# Altium footprint library Vowstar_Connector.PcbLib: 127 footprints (part 5 of 8)
Each footprint in its own frame and in the unit in brackets; x right, y up, seen from the top. Pads: shape width x height; smd on the part's side, far side on the other; paste and mask are expansions set on the pad; w line width, h text height; cw(c..) or ccw(c..) is an arc to the next point about the centre after c.
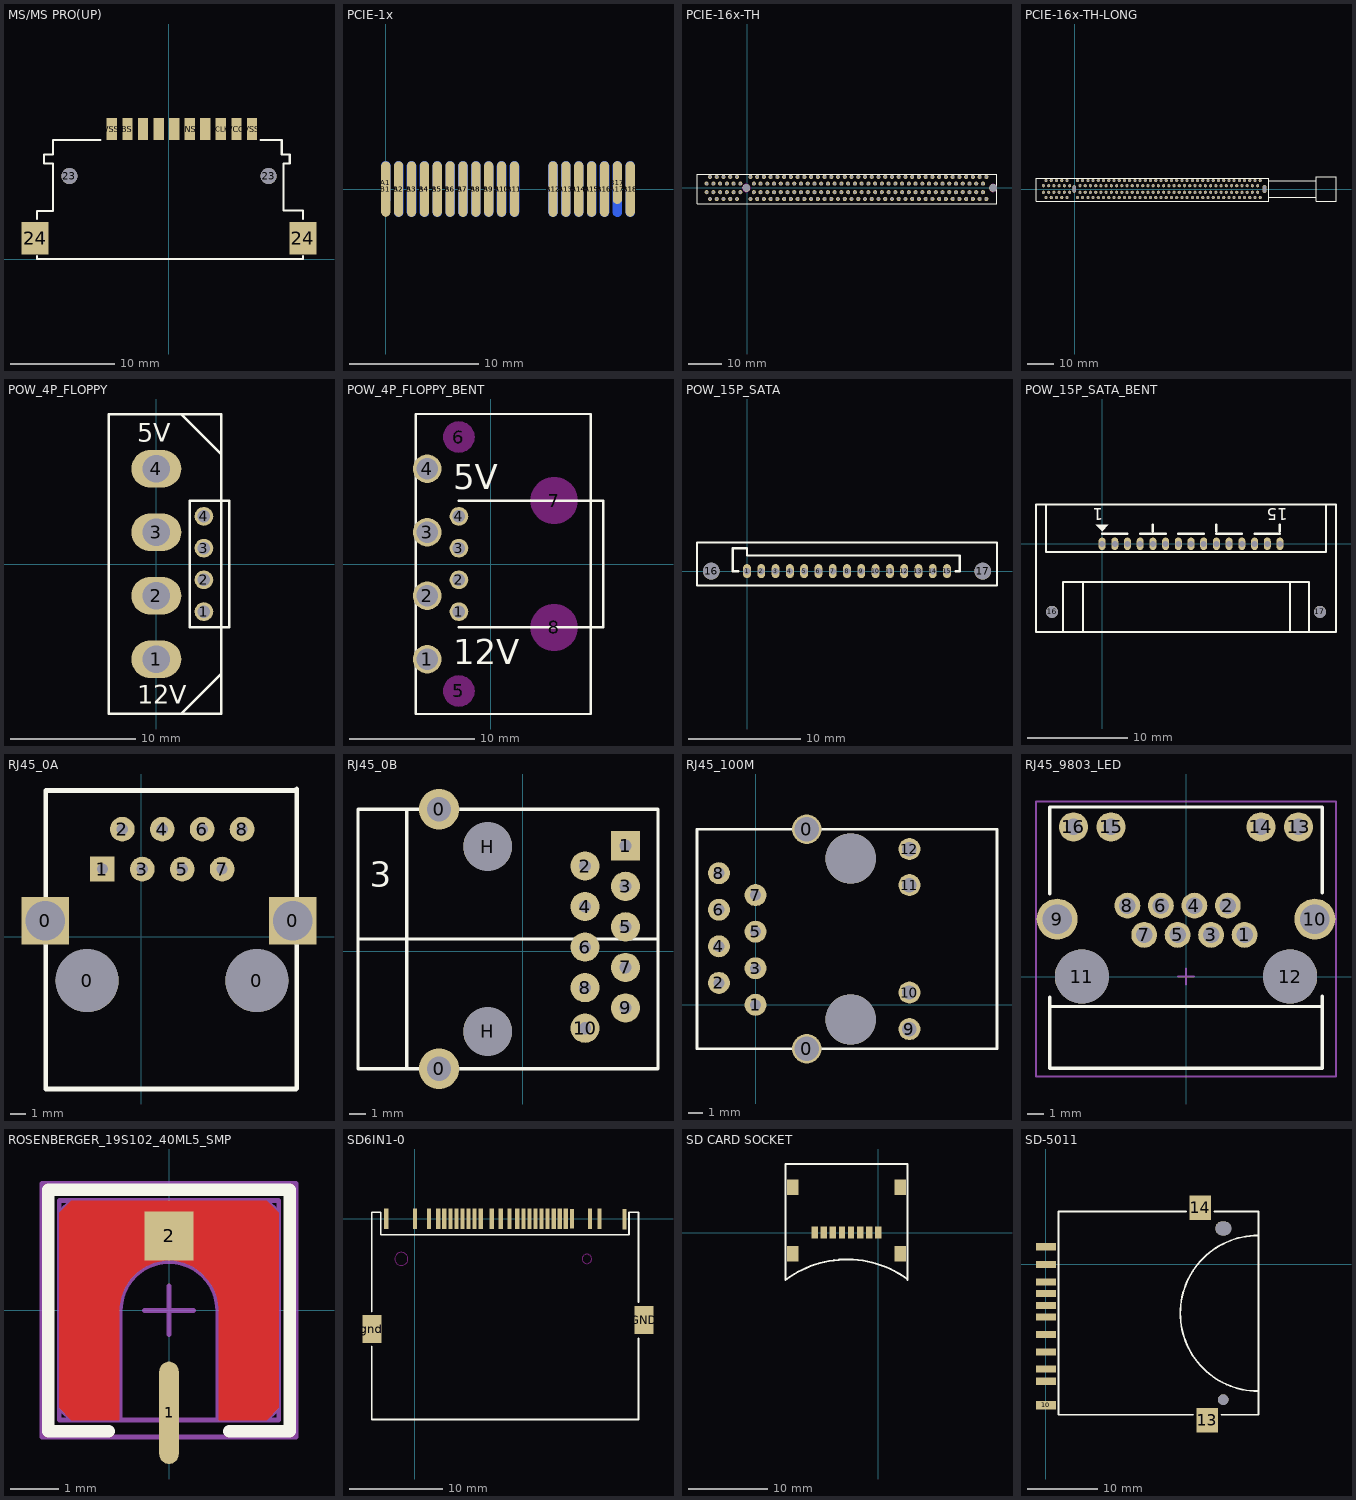
[diagram p4: the footprints below, top view; thin cyan lines are the x and y axes]

## MS/MS PRO(UP) [mm]
pads (15):
  round 0.2 on Top Overlay: 21(0.007,-0.003)
  round 1.55 on Top hole 1.55: 23(-9.593,7.997) 23(9.607,7.997)
  rect 2.6x3.1 smd: 24(-12.893,1.997) 24(12.907,1.997)
  rect 1x2.15 smd: BS(-3.993,12.527) INS(2.007,12.527) MSDATA0(-0.993,12.527) MSDATA1(-2.493,12.527) MSDATA2(0.507,12.527) MSDATA3(3.507,12.527) SCLK(5.007,12.527) VCC(6.507,12.527) VSS(-5.493,12.527) VSS(8.007,12.527)
Top Overlay:
  lines w0.203: -12.717,0.271 -12.717,-0.003 12.901,-0.003 12.901,0.271 ; -12.717,3.853 -12.717,4.649 -11.183,4.649 -11.183,9.213 -12.027,9.213 -12.027,10.057 -11.183,10.057 -11.183,11.454 -6.581,11.454 ; 8.815,11.454 10.868,11.454 10.868,10.057 11.635,10.057 11.635,9.213 11.022,9.213 11.022,4.688 12.901,4.688 ; 12.901,3.853 12.901,4.649

## PCIE-1x [mil]
pads (36):
  oval 28x131 smd far side: A1(0,19.68)
  oval 28x170 smd far side: A2(39.37,0) A3(78.74,0) A4(118.11,0) A5(157.48,0) A6(196.85,0) A7(236.22,0) A8(275.59,0) A9(314.96,0) A10(354.33,0) A11(393.7,0) A12(511.81,0) A13(551.18,0) A14(590.55,0) A15(629.92,0) A16(669.29,0) A17(708.66,0) A18(748.03,0)
  oval 28x170 smd: B1(0,0) B2(39.37,0) B3(78.74,0) B4(118.11,0) B5(157.48,0) B6(196.85,0) B7(236.22,0) B8(275.59,0) B9(314.96,0) B10(354.33,0) B11(393.7,0) B12(511.81,0) B13(551.18,0) B14(590.55,0) B15(629.92,0) B16(669.29,0) B18(748.03,0)
  oval 28x131 smd: B17(708.66,19.68)

## PCIE-16x-TH [mil] "PCIE-16x"
pads (166):
  round 48 hole 30: A1(-472.44,50) A2(-433.07,128.74) A3(-393.7,50) A4(-354.33,128.74) A5(-314.96,50) A6(-275.59,128.74) A7(-236.22,50) A8(-196.85,128.74) A9(-157.48,50) A10(-118.11,128.74) A11(-78.74,50) A12(39.37,128.74) A13(78.74,50) A14(118.11,128.74) A15(157.48,50) A16(196.85,128.74) A17(236.22,50) A18(275.59,128.74) A19(314.96,50) A20(354.33,128.74) A21(393.7,50) A22(433.07,128.74) A23(472.44,50) A24(511.81,128.74) A25(551.18,50) A26(590.55,128.74) A27(629.92,50) A28(669.29,128.74) A29(708.66,50) A30(748.03,128.74) A31(787.4,50) A32(826.77,128.74) A33(866.14,50) A34(905.51,128.74) A35(944.88,50) A36(984.25,128.74) A37(1023.62,50) A38(1062.99,128.74) A39(1102.36,50) A40(1141.73,128.74) A41(1181.1,50) A42(1220.47,128.74) A43(1259.84,50) A44(1299.21,128.74) A45(1338.58,50) A46(1377.95,128.74) A47(1417.32,50) A48(1456.69,128.74) A49(1496.06,50) A50(1535.43,128.74) A51(1574.8,50) A52(1614.17,128.74) A53(1653.54,50) A54(1692.91,128.74) A55(1732.28,50) A56(1771.65,128.74) A57(1811.02,50) A58(1850.39,128.74) A59(1889.76,50) A60(1929.13,128.74) A61(1968.5,50) A62(2007.87,128.74) A63(2047.24,50) A64(2086.61,128.74) A65(2125.98,50) A66(2165.35,128.74) A67(2204.72,50) A68(2244.09,128.74) A69(2283.46,50) A70(2322.83,128.74) A71(2362.2,50) A72(2401.57,128.74) A73(2440.94,50) A74(2480.32,128.74) A75(2519.68,50) A76(2559.06,128.74) A77(2598.43,50) A78(2637.8,128.74) A79(2677.17,50) A80(2716.54,128.74) A81(2755.91,50) A82(2795.28,128.74) B1(-472.44,-50) B2(-433.07,-128.74) B3(-393.7,-50) B4(-354.33,-128.74) B5(-314.96,-50) B6(-275.59,-128.74) B7(-236.22,-50) B8(-196.85,-128.74) B9(-157.48,-50) B10(-118.11,-128.74) B11(-78.74,-50) B12(39.37,-128.74) B13(78.74,-50) B14(118.11,-128.74) B15(157.48,-50) B16(196.85,-128.74) B17(236.22,-50) B18(275.59,-128.74) B19(314.96,-50) B20(354.33,-128.74) B21(393.7,-50) B22(433.07,-128.74) B23(472.44,-50) B24(511.81,-128.74) B25(551.18,-50) B26(590.55,-128.74) B27(629.92,-50) B28(669.29,-128.74) B29(708.66,-50) B30(748.03,-128.74) B31(787.4,-50) B32(826.77,-128.74) B33(866.14,-50) B34(905.51,-128.74) B35(944.88,-50) B36(984.25,-128.74) B37(1023.62,-50) B38(1062.99,-128.74) B39(1102.36,-50) B40(1141.73,-128.74) B41(1181.1,-50) B42(1220.47,-128.74) B43(1259.84,-50) B44(1299.21,-128.74) B45(1338.58,-50) B46(1377.95,-128.74) B47(1417.32,-50) B48(1456.69,-128.74) B49(1496.06,-50) B50(1535.43,-128.74) B51(1574.8,-50) B52(1614.17,-128.74) B53(1653.54,-50) B54(1692.91,-128.74) B55(1732.28,-50) B56(1771.65,-128.74) B57(1811.02,-50) B58(1850.39,-128.74) B59(1889.76,-50) B60(1929.13,-128.74) B61(1968.5,-50) B62(2007.87,-128.74) B63(2047.24,-50) B64(2086.61,-128.74) B65(2125.98,-50) B66(2165.35,-128.74) B67(2204.72,-50) B68(2244.09,-128.74) B69(2283.46,-50) B70(2322.83,-128.74) B71(2362.2,-50) B72(2401.57,-128.74) B73(2440.94,-50) B74(2480.32,-128.74) B75(2519.68,-50) B76(2559.06,-128.74) B77(2598.43,-50) B78(2637.8,-128.74) B79(2677.17,-50) B80(2716.54,-128.74) B81(2755.91,-50) B82(2795.28,-128.74)
  round 86.61 hole 86.61: M1(-7.87,0) M2(2874.02,0)
Top Overlay:
  lines w10: -585,-185 2920,-185 2920,160 -585,160 -585,-185
Keep-Out Layer:
  circle w3.94: c2874.02,0 r43.31
  circle w3.94: c-7.87,0 r43.31
3D body "Samtec-PCIE-164-02-D-F-TH.step": height 434.37, standoff -172.63, extent -585,-185 2919,154

## PCIE-16x-TH-LONG [mil] "PCIE-16x"
pads (166):
  round 48 hole 30: A1(-472.44,50) A2(-433.07,128.74) A3(-393.7,50) A4(-354.33,128.74) A5(-314.96,50) A6(-275.59,128.74) A7(-236.22,50) A8(-196.85,128.74) A9(-157.48,50) A10(-118.11,128.74) A11(-78.74,50) A12(39.37,128.74) A13(78.74,50) A14(118.11,128.74) A15(157.48,50) A16(196.85,128.74) A17(236.22,50) A18(275.59,128.74) A19(314.96,50) A20(354.33,128.74) A21(393.7,50) A22(433.07,128.74) A23(472.44,50) A24(511.81,128.74) A25(551.18,50) A26(590.55,128.74) A27(629.92,50) A28(669.29,128.74) A29(708.66,50) A30(748.03,128.74) A31(787.4,50) A32(826.77,128.74) A33(866.14,50) A34(905.51,128.74) A35(944.88,50) A36(984.25,128.74) A37(1023.62,50) A38(1062.99,128.74) A39(1102.36,50) A40(1141.73,128.74) A41(1181.1,50) A42(1220.47,128.74) A43(1259.84,50) A44(1299.21,128.74) A45(1338.58,50) A46(1377.95,128.74) A47(1417.32,50) A48(1456.69,128.74) A49(1496.06,50) A50(1535.43,128.74) A51(1574.8,50) A52(1614.17,128.74) A53(1653.54,50) A54(1692.91,128.74) A55(1732.28,50) A56(1771.65,128.74) A57(1811.02,50) A58(1850.39,128.74) A59(1889.76,50) A60(1929.13,128.74) A61(1968.5,50) A62(2007.87,128.74) A63(2047.24,50) A64(2086.61,128.74) A65(2125.98,50) A66(2165.35,128.74) A67(2204.72,50) A68(2244.09,128.74) A69(2283.46,50) A70(2322.83,128.74) A71(2362.2,50) A72(2401.57,128.74) A73(2440.94,50) A74(2480.32,128.74) A75(2519.68,50) A76(2559.06,128.74) A77(2598.43,50) A78(2637.8,128.74) A79(2677.17,50) A80(2716.54,128.74) A81(2755.91,50) A82(2795.28,128.74) B1(-472.44,-50) B2(-433.07,-128.74) B3(-393.7,-50) B4(-354.33,-128.74) B5(-314.96,-50) B6(-275.59,-128.74) B7(-236.22,-50) B8(-196.85,-128.74) B9(-157.48,-50) B10(-118.11,-128.74) B11(-78.74,-50) B12(39.37,-128.74) B13(78.74,-50) B14(118.11,-128.74) B15(157.48,-50) B16(196.85,-128.74) B17(236.22,-50) B18(275.59,-128.74) B19(314.96,-50) B20(354.33,-128.74) B21(393.7,-50) B22(433.07,-128.74) B23(472.44,-50) B24(511.81,-128.74) B25(551.18,-50) B26(590.55,-128.74) B27(629.92,-50) B28(669.29,-128.74) B29(708.66,-50) B30(748.03,-128.74) B31(787.4,-50) B32(826.77,-128.74) B33(866.14,-50) B34(905.51,-128.74) B35(944.88,-50) B36(984.25,-128.74) B37(1023.62,-50) B38(1062.99,-128.74) B39(1102.36,-50) B40(1141.73,-128.74) B41(1181.1,-50) B42(1220.47,-128.74) B43(1259.84,-50) B44(1299.21,-128.74) B45(1338.58,-50) B46(1377.95,-128.74) B47(1417.32,-50) B48(1456.69,-128.74) B49(1496.06,-50) B50(1535.43,-128.74) B51(1574.8,-50) B52(1614.17,-128.74) B53(1653.54,-50) B54(1692.91,-128.74) B55(1732.28,-50) B56(1771.65,-128.74) B57(1811.02,-50) B58(1850.39,-128.74) B59(1889.76,-50) B60(1929.13,-128.74) B61(1968.5,-50) B62(2007.87,-128.74) B63(2047.24,-50) B64(2086.61,-128.74) B65(2125.98,-50) B66(2165.35,-128.74) B67(2204.72,-50) B68(2244.09,-128.74) B69(2283.46,-50) B70(2322.83,-128.74) B71(2362.2,-50) B72(2401.57,-128.74) B73(2440.94,-50) B74(2480.32,-128.74) B75(2519.68,-50) B76(2559.06,-128.74) B77(2598.43,-50) B78(2637.8,-128.74) B79(2677.17,-50) B80(2716.54,-128.74) B81(2755.91,-50) B82(2795.28,-128.74)
  oval 59.06x118.11 hole 39.37 slot 98.43 at 90 deg: M1(-7.87,0) M2(2858.27,0)
Top Overlay:
  lines w10: 2925,-125.98 3640,-125.98 ; 2925,125.98 3640,125.98 ; -585,-185 -585,160 2920,160 2920,-185 -585,-185 ; 3641.73,-185 3937.01,-185 3937.01,185 3641.73,185 3641.73,-185
3D body "Samtec-PCIE-164-02-D-F-TH.step": height 434.37, standoff -172.63, extent -585,-185 2919,154

## POW_4P_FLOPPY [mm] "4P power connector for hard drive or floppy"
pads (8):
  oval 4x3 hole 2.2: 1(0,-7.62) 2(0,-2.54) 3(0,2.54) 4(0,7.62)
  round 1.5 hole 1: 1(3.81,-3.81) 2(3.81,-1.27) 3(3.81,1.27) 4(3.81,3.81)
Top Overlay:
  lines w0.2: 1.968,-12.002 5.143,-8.826 ; 1.968,12.002 5.207,8.763 ; 5.08,-5.08 5.842,-5.08 5.842,5.08 5.08,5.08 ; 5.207,-5.08 2.667,-5.08 2.667,5.08 5.207,5.08 ; 5.207,-5.08 5.207,5.08 ; 5.207,-5.08 5.207,-12 -3.81,-12 -3.81,12 5.207,12 5.207,5.08
  text "5V" at -1.524,9.779 h1.5
  text "12V" at -1.524,-11.176 h1.5
3D body "User Library-Molex disk drive power connector.step": height 12.19, standoff 0, extent -3.683,-11.684 5.207,11.684

## POW_4P_FLOPPY_BENT [mm] "4P power connector for hard drive or floppy"
pads (12):
  round 2.3 hole 1.7: 1(-5.08,-7.62) 2(-5.08,-2.54) 3(-5.08,2.54) 4(-5.08,7.62)
  round 1.5 hole 1: 1(-2.54,-3.81) 2(-2.54,-1.27) 3(-2.54,1.27) 4(-2.54,3.81)
  round 2.54 on Keep-Out: 5(-2.54,-10.16) 6(-2.54,10.16)
  round 3.8 on Keep-Out: 7(5.08,5.08) 8(5.08,-5.08)
Top Overlay:
  lines w0.2: -2.54,-5.08 9,-5.08 9,5.08 -2.54,5.08 ; -6,-12 -6,12 8,12 8,-12 -6,-12
  text "5V" at -3,6 h2
  text "12V" at -3,-8 h2
3D body "User Library-Molex disk drive power connector.step": height 8.79, standoff -0.1, extent -5.08,-11.684 7.112,11.684

## POW_15P_SATA [mm] "15P power connector for serial ata interface"
pads (17):
  oval 0.7x1.25 hole 0.6: 1(0,0) 2(1.27,0) 3(2.54,0) 4(3.81,0) 5(5.08,0) 6(6.35,0) 7(7.62,0) 8(8.89,0) 9(10.16,0) 10(11.43,0) 11(12.7,0) 12(13.97,0) 13(15.24,0) 14(16.51,0) 15(17.78,0)
  round 1.5 hole 1.5: 16(-3.175,0) 17(20.955,0)
Top Overlay:
  lines w0.2: -0.762,0 -1.27,0 -1.27,2.032 0,2.032 0,1.397 18.923,1.397 18.923,0 18.542,0 ; -4.445,-1.27 22.225,-1.27 22.225,2.54 -4.445,2.54 -4.445,-1.27

## POW_15P_SATA_BENT [mm] "15P power connector for serial ata interface"
pads (17):
  oval 0.7x1.25 hole 0.6: 1(0,0) 2(1.27,0) 3(2.54,0) 4(3.81,0) 5(5.08,0) 6(6.35,0) 7(7.62,0) 8(8.89,0) 9(10.16,0) 10(11.43,0) 11(12.7,0) 12(13.97,0) 13(15.24,0) 14(16.51,0) 15(17.78,0)
  round 1.2 hole 1.2: 16(-5,-6.8) 17(21.78,-6.8)
Top Overlay:
  region: 0,1.27 -0.635,1.905 0.635,1.905
  lines w0.2: -5.6,3.9 -5.6,-0.8 22.28,-0.8 ; -3.9,-8.8 -3.9,-3.8 20.68,-3.8 20.68,-8.8 ; -1.9,-8.8 -1.9,-3.8 ; 18.78,-8.8 18.78,-3.8 ; 22.38,-0.8 22.38,3.9 ; -6.6,-8.8 23.38,-8.8 23.38,3.9 -6.6,3.9 -6.6,-8.8
  lines w0.254: 0,1.016 2.54,1.016 ; 3.81,1.016 6.35,1.016 ; 5.08,1.27 5.08,1.905 ; 7.62,1.016 10.16,1.016 ; 11.43,1.016 13.97,1.016 ; 11.43,1.27 11.43,1.905 ; 15.24,1.016 17.78,1.016 ; 17.78,1.27 17.78,1.905
  text "1" at 0.127,3.556 h1.2
  text "15" at 18.542,3.556 h1.2

## RJ45_0A [mil]
pads (12):
  rect 118.11x118.11 hole 98.42: 0(-240,40) 0(380,40)
  round 157.48 hole 157.48: 0(-135,-110) 0(290,-110)
  rect 62x62 hole 28: 1(-96.89,169.37)
  round 62 hole 28: 2(-46.89,269.37) 3(3.11,169.37) 4(53.11,269.37) 5(103.11,169.37) 6(153.11,269.37) 7(203.11,169.37) 8(253.11,269.37)
Top Overlay:
  lines w12: 388.78,-381.22 352.52,-381.22 -188.03,-381.22 -238.78,-381.22 -238.78,366.22 -213.78,366.22 -187.64,366.22 353.11,366.22 386.22,366.22 388.78,368.78 ; 390,-380 390,370

## RJ45_0B [mm]
pads (14):
  round 2.5 hole 1.5: 0(-5.16,-7.258) 0(-5.16,8.742)
  rect 1.8x1.8 hole 0.762: 1(6.34,6.492)
  round 1.8 hole 0.762: 2(3.84,5.242) 3(6.34,3.992) 4(3.84,2.742) 5(6.34,1.492) 6(3.84,0.242) 7(6.34,-1.008) 8(3.84,-2.258) 9(6.34,-3.508) 10(3.84,-4.758)
  round 3 hole 3: H(-2.16,-4.958) H(-2.16,6.442)
Top Overlay:
  lines w0.2: -10.16,0.742 8.34,0.742 ; -7.16,-7.258 -7.16,8.742 ; -10.16,-7.258 -10.16,8.742 8.34,8.742 8.34,-7.258 -10.16,-7.258
  text "3" at -9.446,3.979 h1.52

## RJ45_100M [mil]
pads (16):
  round 80 hole 66.93: 0(140,-120) 0(140,480)
  round 60 hole 30: 1(0,0) 2(-100,60) 3(0,100) 4(-100,160) 5(0,200) 6(-100,260) 7(0,300) 8(-100,360)
  round 60 hole 39.37: 9(420.63,-66.31) 10(420.63,33.69) 11(420.63,327.39) 12(420.63,425.81)
  round 137.79 hole 137.79: ""(260,-40) ""(260,400)
Top Overlay:
  lines w7.87: -160,-120 -160,480 660,480 660,-120 -160,-120

## RJ45_9803_LED [mm] "RJ45 9803 With LED"
height 13.1
pads (16):
  round 1.575 hole 1: 1(3.57,2.54) 2(2.55,4.32) 3(1.53,2.54) 4(0.51,4.32) 5(-0.51,2.54) 6(-1.53,4.32) 7(-2.55,2.54) 8(-3.57,4.32)
  round 2.5 hole 1.8: 9(-7.85,3.5) 10(7.85,3.5)
  round 3.3 hole 3.3 unplated: 11(-6.35,0) 12(6.35,0)
  round 1.778 hole 1: 13(6.86,9.12) 14(4.57,9.12) 15(-4.57,9.12) 16(-6.86,9.12)
Top Overlay:
  lines w0.203: -8.3,-1.829 8.3,-1.829 ; -8.3,-1.265 -8.3,-5.588 8.3,-5.588 8.3,-1.214 ; -8.3,5.034 -8.3,10.338 8.3,10.338 8.3,5.085
Mechanical 15:
  lines w0.1: -0.5,0 0.5,0 ; 0,-0.5 0,0.5 ; -9.144,-6.096 9.144,-6.096 9.144,10.668 -9.144,10.668 -9.144,-6.096
3D body "User Library-RJ45-9803-LED.step": height 14.75, standoff -3.68, extent -8.355,-5.986 8.355,10.264

## ROSENBERGER_19S102_40ML5_SMP [mm] "Rosenberger SMP  RF CONNECTOR 0-40GHz STRAIGHT PLUG PCB  LIMITED DETENT, SMD,"
height 5.4
pads (2):
  oval 0.4x2.1 smd: 1(0,-2.1)
  rect 1x1 smd paste-100 mask-100: 2(0,1.524)
Top Layer:
  region: -1.025,-2.25 -2,-2.25 -2.25,-2 -2.25,2 -2,2.25 2,2.25 2.25,2 2.25,-2 2,-2.25 1.025,-2.25 1.025,-0.05 1.022,0.053 0.987,0.256 0.913,0.448 0.803,0.622 0.66,0.771 0.492,0.889 0.304,0.973 0.103,1.017 0,1.025 -0.102,1.019 -0.301,0.977 -0.488,0.897 -0.655,0.782 -0.797,0.636 -0.908,0.466 -0.984,0.277 -1.021,0.077 -1.025,-0.025
Top Overlay:
  lines w0.254: -1.237,-2.475 -2.475,-2.475 -2.475,2.475 2.475,2.475 2.475,-2.475 1.237,-2.475
Top Paste:
  region: -0.889,0.762 -0.889,2.159 0.889,2.159 0.889,0.762 0.381,1.143 -0.381,1.143
  region: 2.159,-1.143 2.159,-1.905 1.905,-2.159 1.143,-2.159 1.143,-1.143
  region: 2.159,-0.889 1.143,-0.889 1.143,-0.127 2.159,-0.127
  region: 2.159,0.127 1.143,0.127 1.143,0.889 2.159,0.889
  region: 1.143,2.159 1.905,2.159 2.159,1.905 2.159,1.143 1.143,1.143
  region: -2.159,1.143 -2.159,1.905 -1.905,2.159 -1.143,2.159 -1.143,1.143
  region: -1.143,0.127 -2.159,0.127 -2.159,0.889 -1.143,0.889
  region: -1.143,-0.889 -2.159,-0.889 -2.159,-0.127 -1.143,-0.127
  region: -1.143,-2.159 -1.905,-2.159 -2.159,-1.905 -2.159,-1.143 -1.143,-1.143
Top Solder:
  region: -0.95,-2.325 -2.025,-2.325 -2.325,-2.025 -2.325,2.025 -2.025,2.325 2.025,2.325 2.325,2.025 2.325,-2.025 2.025,-2.325 0.95,-2.325 0.95,-0.15 0.95,-0.049 0.92,0.15 0.853,0.339 0.749,0.512 0.614,0.661 0.452,0.78 0.27,0.866 0.075,0.915 -0.025,0.925 -0.123,0.913 -0.312,0.86 -0.488,0.772 -0.642,0.65 -0.771,0.501 -0.867,0.33 -0.929,0.143 -0.953,-0.052 -0.95,-0.15
Mechanical 13:
  lines w0.1: -2.242,-1.993 ccw(c0,0) -1.993,-2.242 ; -2.242,1.993 cw(c0,0) -1.993,2.242 ; -1,-2.25 -1,0 cw(c0,0) 1,0 1,-2.25 ; 1.993,-2.242 ccw(c0,0) 2.242,-1.993 ; 1.993,2.242 cw(c0,0) 2.242,1.993 ; -2.25,-2.25 -2.25,2.25 2.25,2.25 2.25,-2.25 -2.25,-2.25
Mechanical 15:
  lines w0.1: -0.5,0 0.5,0 ; 0,-0.5 0,0.5 ; -2.6,-2.6 2.6,-2.6 2.6,2.6 -2.6,2.6 -2.6,-2.6
3D body "19S102-40ML5.step": height 4.4, standoff 0, extent -2.25,-2.835 2.25,2.25

## SD6IN1-0 [mm]
pads (29):
  rect 0.45x2.2 smd: 1(0,0) 2(1.5,0) 3(2.5,0) 4(3.15,0) 5(3.8,0) 6(4.45,0) 7(5.1,0) 8(5.75,0) 9(6.4,0) 10(7.05,0) 11(8.24,0) 12(9.19,0) 13(10.14,0) 14(10.976,0) 15(11.626,0) 16(12.276,0) 17(12.926,0) 18(13.576,0) 19(14.226,0) 20(14.876,0) 24(18.77,0) 25(19.8,0) 25(22.46,-0.051) 26(-3.08,0)
  rect 0.44x2.2 smd: 21(15.526,0) 22(16.176,0)
  rect 0.45x2.1 smd: 23(16.826,0)
  rect 2x3 smd: gnd(-4.61,-11.825) GND(24.565,-10.875)
Top Overlay:
  lines w0.203: -4.636,-13.703 -4.636,-21.514 23.99,-21.514 23.99,-12.84 ; -4.636,-9.97 -4.636,0.711 -3.67,0.711 ; 23.99,-8.903 23.99,0.711 23.279,0.711 22.949,0.711 22.949,-1.702 -3.67,-1.702 ; -3.67,-1.702 -3.67,0.711 ; -3.67,-1.702 -3.67,0.711
Keep-Out Layer:
  lines w0.1: -2.16,-4.3 cw(c-1.46,-4.3) -0.76,-4.3 cw(c-1.46,-4.3) -2.16,-4.3 ; 17.94,-4.3 cw(c18.44,-4.3) 18.94,-4.3 cw(c18.44,-4.3) 17.94,-4.3

## SD CARD SOCKET [mm]
pads (12):
  rect 0.8x1.5 smd: 1(0,0) 2(-1.143,0) 3(-2.286,0) 4(-3.429,0) 5(-4.572,0) 6(-5.715,0) 7(-6.858,0) 8(-8.001,0)
  rect 1.45x2 smd: ""(-10.795,-2.667) ""(-10.795,5.715) ""(2.794,-2.667) ""(2.794,5.715)
Top Overlay:
  lines w0.254: 3.607,-5.82 ccw(c-3.937,-16.256) -11.684,-5.969 -11.684,8.636 3.683,8.636 3.683,-5.969

## SD-5011 [mm] "SD CARD For TQ210"
pads (16):
  rect 2.8x1 smd: 1(0,0) 2(0,-2.5) 3(0,-5.8) 4(0,-7.4) 5(0,-9.9) 6(0,-12.4) 7(0,-14.8) 8(0,-16.5) 9(0,2.5) 11(0,-4.1)
  rect 2.8x1.2 smd: 10(0,-19.9)
  rect 3x3.5 smd: 13(22.8,-22) 14(21.8,8)
  round 2 hole 2: ""(24.946,5.1) ""(25.2,5.1)
  round 1.5 hole 1.5: ""(25.046,-19.1)
Top Overlay:
  lines w0.254: 19.8,7.5 1.8,7.5 1.8,-21.25 20.8,-21.25 ; 23.8,7.5 30.05,7.5 30.05,-21.25 24.8,-21.25 ; 30,-17.9 cw(c30,-6.9) 30,4.1